# Altium footprint library TH Connectors.PcbLib: 140 footprints (part 9 of 9)
Each footprint in its own frame and in the unit in brackets; x right, y up, seen from the top. Pads: shape width x height; smd on the part's side, far side on the other; paste and mask are expansions set on the pad; w line width, h text height; cw(c..) or ccw(c..) is an arc to the next point about the centre after c.
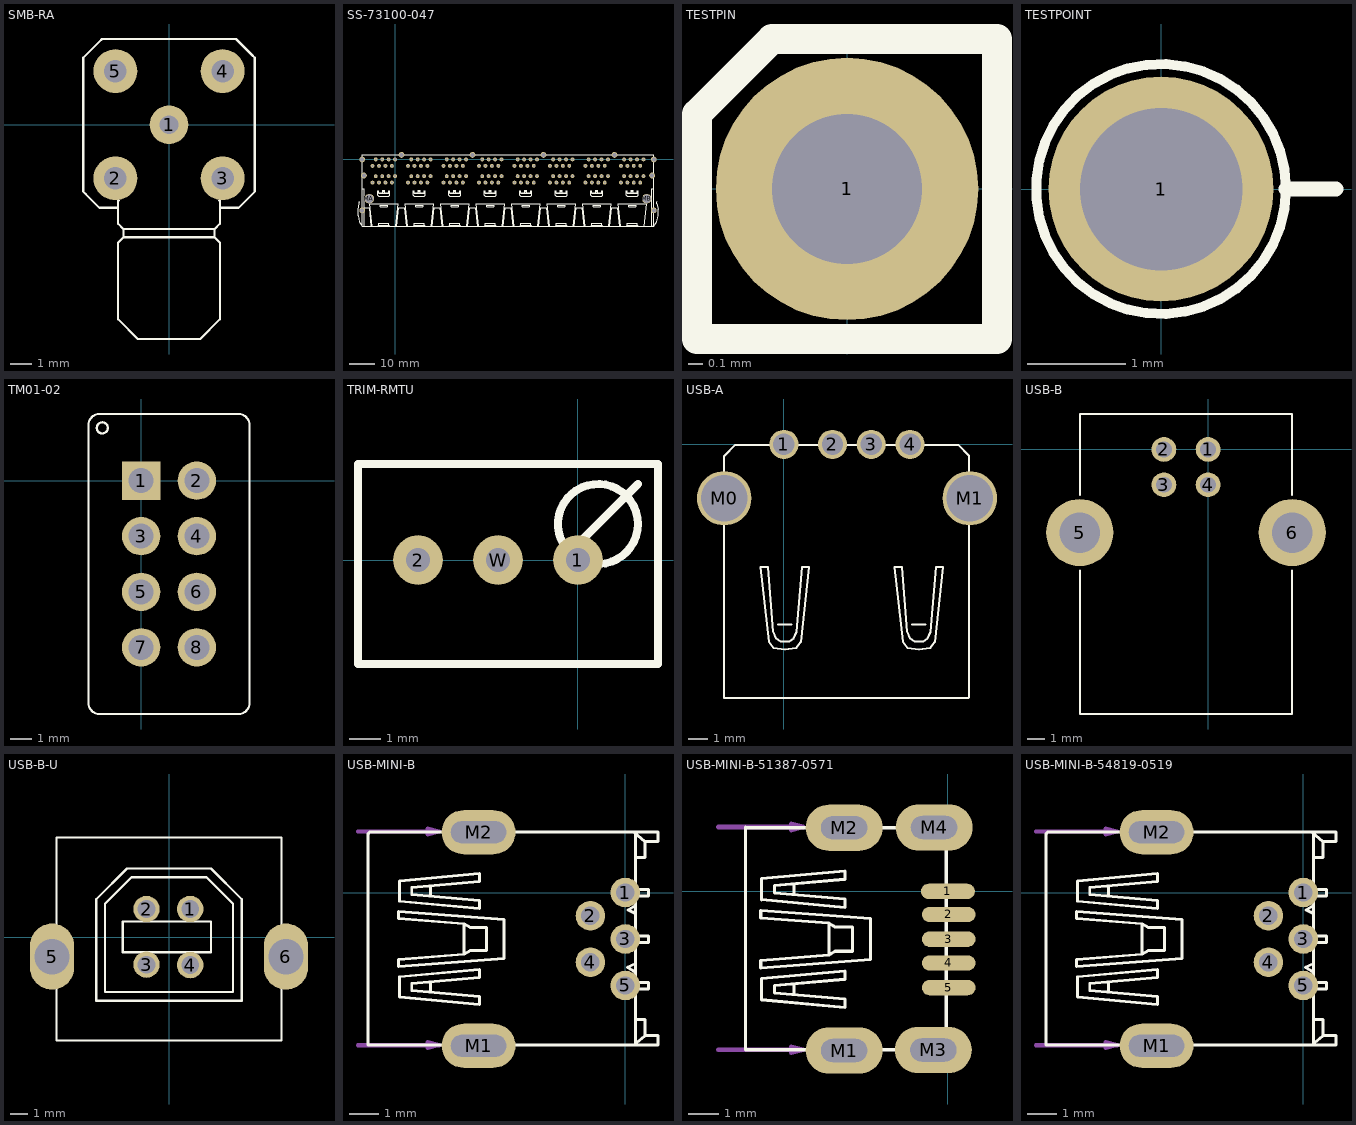
[diagram p8: the footprints below, top view; thin cyan lines are the x and y axes]

## SMB-RA [mil]
pads (5):
  round 72 hole 35: 1(0,0)
  round 82 hole 42: 2(-100,-100) 3(100,-100) 4(100,100) 5(-100,100)
Top Overlay:
  lines w4: -155,-130 -160,-125 ; -95,-155 -130,-155 -160,-125 ; -93.33,-141.67 -95,-140 -95,-185 -85,-195 ; 75,-383.33 58.33,-400 ; 93.33,-141.67 95,-140 95,-185 85,-195 ; 95,-155 130,-155 160,-125 160,80 ; 160,75 160,125 155,130 125,160 -125,160 -130,155 -160,125 -160,-125 ; -85,-210 -85,-200 -85,-195 ; -85,-210 -95,-220 -95,-363.33 -58.33,-400 ; -85,-210 85,-210 ; -85,-195 85,-195 ; -58.33,-400 -75,-383.33 -58.33,-400 ; -58.33,-400 58.33,-400 ; 58.33,-400 95,-363.33 95,-220 85,-210 ; 85,-210 85,-200 85,-195

## SS-73100-047 [mil]
pads (140):
  round 60 hole 40: A1(0,0)
  round 60 hole 30: A2(-50,-100) A3(-100,0) A4(-150,-100) A5(-200,0) A6(-250,-100) A7(-300,0) A8(-350,-100) B1(550,0) B2(500,-100) B3(450,0) B4(400,-100) B5(350,0) B6(300,-100) B7(250,0) B8(200,-100) C1(1100,0) C2(1050,-100) C3(1000,0) C4(950,-100) C5(900,0) C6(850,-100) C7(800,0) C8(750,-100) D1(1650,0) D2(1600,-100) D3(1550,0) D4(1500,-100) D5(1450,0) D6(1400,-100) D7(1350,0) D8(1300,-100) E1(2200,0) E2(2150,-100) E3(2100,0) E4(2050,-100) E5(2000,0) E6(1950,-100) E7(1900,0) E8(1850,-100) F1(2750,0) F2(2700,-100) F3(2650,0) F4(2600,-100) F5(2550,0) F6(2500,-100) F7(2450,0) F8(2400,-100) G1(3300,0) G2(3250,-100) G3(3200,0) G4(3150,-100) G5(3100,0) G6(3050,-100) G7(3000,0) G8(2950,-100) H1(3850,0) H2(3800,-100) H3(3750,0) H4(3700,-100) H5(3650,0) H6(3600,-100) H7(3550,0) H8(3500,-100) I1(-350,-360) I2(-300,-260) I3(-250,-360) I4(-200,-260) I5(-150,-360) I6(-100,-260) I7(-50,-360) I8(0,-260) J1(200,-360) J2(250,-260) J3(300,-360) J4(350,-260) J5(400,-360) J6(450,-260) J7(500,-360) J8(550,-260) K1(750,-360) K2(800,-260) K3(850,-360) K4(900,-260) K5(950,-360) K6(1000,-260) K7(1050,-360) K8(1100,-260) L1(1300,-360) L2(1350,-260) L3(1400,-360) L4(1450,-260) L5(1500,-360) L6(1550,-260) L7(1600,-360) L8(1650,-260) M1(1850,-360) M2(1900,-260) M3(1950,-360) M4(2000,-260) M5(2050,-360) M6(2100,-260) M7(2150,-360) M8(2200,-260) N1(2400,-360) N2(2450,-260) N3(2500,-360) N4(2550,-260) N5(2600,-360) N6(2650,-260) N7(2700,-360) N8(2750,-260) O1(2950,-360) O2(3000,-260) O3(3050,-360) O4(3100,-260) O5(3150,-360) O6(3200,-260) O7(3250,-360) O8(3300,-260) P1(3500,-360) P2(3550,-260) P3(3600,-360) P4(3650,-260) P5(3700,-360) P6(3750,-260) P7(3800,-360) P8(3850,-260)
  round 150 hole 131 unplated: MA(-400,-610) MB(3900,-610)
  round 90 hole 62: MC(-510,-790) MD(-484,-250) ME(-510,-1) MF(100,70) MG(1200,70) MH(2300,70) MI(3400,70) MJ(4010,-1) MK(3984,-250) ML(4010,-790)
Top Overlay:
  drawing of 374 lines, arcs and shapes, not listed

## TESTPIN [mil]
pads (1):
  round 70 hole 40: 1(0,0)
Top Overlay:
  lines w8: -40,-40 -40,20 -20,40 40,40 40,-40 -40,-40
3D body: height 40, standoff 0, extent -40,-40 40,40
3D body: height 470, standoff -120, extent -15,-15 15,15

## TESTPOINT [mil]
pads (1):
  round 90 hole 65: 1(0,0)
Top Overlay:
  circle w4: c0,0 r50
  lines w6: 50,0 70,0
3D body: height 253.89, standoff 146.11, extent -53.79,-23.5 53.79,21.5
3D body: height 150, standoff -100, extent -19.84,-20 20,19.92
3D body: height 125, standoff 5, extent -52,-51.79 51.59,52

## TM01-02 [mil]
pads (8):
  rect 69x69 hole 45: 1(0,0)
  round 69 hole 45: 2(100,0) 3(0,-100) 4(100,-100) 5(0,-200) 6(100,-200) 7(0,-300) 8(100,-300)
Top Overlay:
  circle w4: c-70,95 r10
  lines w4: -95,-400 ccw(c-75,-400) -75,-420 50,-420 175,-420 ccw(c175,-400) 195,-400 195,100 ccw(c175,100) 175,120 50,120 -75,120 ccw(c-75,100) -95,100 -95,-400

## TRIM-RMTU [mil]
pads (3):
  round 62 hole 30: 1(0,0) 2(-200,0) W(-100,0)
Top Overlay:
  circle w10: c25,45 r50
  lines w10: -25,-5 50,70 ; 25,45 75,95 ; -275,-130 100,-130 100,120 -275,120 -275,-130

## USB-A [mm]
pads (6):
  round 1.5 hole 1.1: 1(0,0) 2(2.5,0) 3(4.5,0) 4(6.5,0)
  round 2.8 hole 2.4: M0(-3.075,-2.775) M1(9.575,-2.775)
Top Overlay:
  lines w0.102: -0.3,-9.275 0.025,-9.275 ; 0.075,-9.275 0.4,-9.275 ; 6.6,-9.275 6.925,-9.275 ; 6.975,-9.275 7.3,-9.275 ; -3.075,-13.075 9.5,-13.075 9.525,-13.05 9.525,-0.575 8.975,-0.025 -2.5,-0.025 -3.075,-0.6 -3.075,-2.775 -3.075,-13.075 ; -1.2,-6.325 -0.775,-10.175 -0.525,-10.5 0.05,-10.575 0.625,-10.5 0.875,-10.175 1.3,-6.325 0.925,-6.325 0.65,-9.65 0.5,-10 0.275,-10.15 0.05,-10.15 -0.175,-10.15 -0.4,-10 -0.55,-9.65 -0.825,-6.325 -1.2,-6.325 ; 5.7,-6.325 6.125,-10.175 6.375,-10.5 6.95,-10.575 7.525,-10.5 7.775,-10.175 8.2,-6.325 7.825,-6.325 7.55,-9.65 7.4,-10 7.175,-10.15 6.95,-10.15 6.725,-10.15 6.5,-10 6.35,-9.65 6.075,-6.325 5.7,-6.325

## USB-B [mil]
pads (6):
  round 55 hole 35: 1(0,0) 2(-98.42,0) 3(-98.42,-78.74) 4(0,-78.74)
  round 150 hole 90.55: 5(-286.22,-185.43) 6(187.8,-185.43)
Top Overlay:
  lines w4: -285.43,-269.29 -285.43,-590.16 187.01,-590.16 187.01,-269.29 ; -285.43,-101.58 -285.43,79.13 187.01,79.13 187.01,-101.58
3D body: height 436.54, standoff -162.68, extent -342.51,-589.79 242.51,79.5

## USB-B-U [mil]
pads (6):
  round 60 hole 40 mask+2: 1(48,63.5) 2(-51,63.5) 3(-51,-62.5) 4(48,-63.5)
  oval 100x150 hole 80 mask+2: 5(-265,-44.5) 6(265,-44.5)
Top Overlay:
  lines w5: -185,225.5 195,225.5 ; -165,-234.5 125,-234.5 ; 255,-134.5 255,175.5 ; -255,-234.5 -255,-144.5 -255,185.5 -255,225.5 255,225.5 255,-234.5 -255,-234.5 ; -165,-144.5 -165,85.5 -95,155.5 65,155.5 95,155.5 165,85.5 165,-144.5 -165,-144.5 ; -145,-124.5 145,-124.5 145,75.5 85,135.5 -85,135.5 -145,75.5 -145,-124.5 ; -105,-34.5 -105,35.5 95,35.5 95,-34.5 -105,-34.5
3D body: height 640, standoff -149.21, extent -290.12,-235.13 288.62,209.75

## USB-MINI-B [mil]
pads (7):
  round 40 hole 25: 1(0,0) 2(-47.24,-31.5) 3(0,-62.99) 4(-47.24,-94.49) 5(0,-125.98)
  oval 100x60 hole 30 slot 75 at 0 deg: M1(-198.82,-207.68) M2(-198.82,81.69)
Top Overlay:
  lines w4: -348.43,-206.69 44.29,-206.69 44.29,-193.9 26.57,-193.9 ; -348.43,79.72 -346.46,81.69 44.29,81.69 44.29,68.9 26.57,68.9 ; -348.43,-206.69 -348.43,79.72 ; -289.37,-124.02 -289.37,-132.87 -197.83,-140.75 -197.83,-151.57 -306.1,-141.73 -306.1,-114.17 -197.83,-104.33 -197.83,-115.16 -289.37,-123.03 ; -289.37,-2.95 -197.83,-10.83 -197.83,-21.65 -306.1,-11.81 -306.1,15.75 -197.83,25.59 -197.83,14.76 -289.37,6.89 -289.37,-1.97 ; -263.78,-133.86 -263.78,-123.03 ; -263.78,-2.95 -263.78,7.87 ; 11.81,-206.69 26.57,-193.9 ; 11.81,81.69 26.57,68.9 ; 13.78,-130.91 31.5,-130.91 31.5,-122.05 13.78,-122.05 ; 13.78,-108.27 2.95,-101.38 13.78,-96.46 ; 13.78,-67.91 31.5,-67.91 31.5,-59.05 13.78,-59.05 ; 13.78,-28.54 3.94,-23.62 13.78,-17.72 ; 13.78,-4.92 31.5,-4.92 31.5,3.94 13.78,3.94 ; -218.5,-83.66 -307.09,-90.55 -307.09,-100.39 -164.37,-89.57 -164.37,-62.99 -164.37,-36.42 -307.09,-25.59 -307.09,-35.43 -218.5,-42.32 ; -218.5,-83.66 -210.63,-78.74 -187.99,-78.74 -187.99,-62.99 -187.99,-47.24 -210.63,-47.24 -218.5,-42.32 ; -218.5,-83.66 -218.5,-62.99 -218.5,-42.32 ; 26.57,-193.9 26.57,-172.24 13.78,-172.24 13.78,-206.69 13.78,81.69 13.78,47.24 26.57,47.24 26.57,68.9
Mechanical 1:
  lines w6: -362.2,-206.69 -251.97,-206.69 ; -362.2,82.68 -251.97,82.68 ; -196.85,-194.88 -175.2,-194.88 cw(c-175.2,-208.66) -161.42,-208.66 cw(c-175.2,-208.66) -175.2,-222.44 -224.41,-222.44 cw(c-224.41,-210.63) -236.22,-210.63 -236.22,-206.69 cw(c-224.41,-206.69) -224.41,-194.88 -177.17,-194.88 ; -196.85,94.49 -175.2,94.49 cw(c-175.2,80.71) -161.42,80.71 cw(c-175.2,80.71) -175.2,66.93 -224.41,66.93 cw(c-224.41,78.74) -236.22,78.74 -236.22,82.68 cw(c-224.41,82.68) -224.41,94.49 -177.17,94.49 ; -251.97,-206.69 -267.72,-202.76 -267.72,-210.63 -251.97,-206.69 ; -251.97,82.68 -267.72,78.74 -267.72,86.61 -251.97,82.68
  text "1.9 mm X 0.7 mm slot" at -944.88,70.87 h30
  text "1.9 mm X 0.7 mm slot" at -937.01,-216.54 h30
3D body: height 161.77, standoff -64.61, extent -345.33,-214.07 9,89.07

## USB-MINI-B-51387-0571 [mil] "MOLEX 51387-0571"
pads (9):
  oval 70x20 smd: 1(0,0) 2(1,-30) 3(1,-61.99) 4(1,-93) 5(1,-124.98)
  oval 100x60 hole 30 slot 60 at 0 deg: M1(-134.82,-206.68) M2(-134.82,82.69) M3(-19,-206) M4(-18,83)
Top Overlay:
  lines w4: -225.37,-123.02 -225.37,-131.87 -133.83,-139.75 -133.83,-150.57 -242.1,-140.73 -242.1,-113.17 -133.83,-103.33 -133.83,-114.16 -225.37,-122.03 ; -225.37,-1.95 -133.83,-9.83 -133.83,-20.65 -242.1,-10.81 -242.1,16.75 -133.83,26.59 -133.83,15.76 -225.37,7.89 -225.37,-0.97 ; -199.78,-132.86 -199.78,-122.03 ; -199.78,-1.95 -199.78,8.87 ; -154.5,-82.66 -243.09,-89.55 -243.09,-99.39 -100.37,-88.57 -100.37,-61.99 -100.37,-35.42 -243.09,-24.59 -243.09,-34.43 -154.5,-41.32 ; -154.5,-82.66 -146.63,-77.74 -123.99,-77.74 -123.99,-61.99 -123.99,-46.24 -146.63,-46.24 -154.5,-41.32 ; -154.5,-82.66 -154.5,-61.99 -154.5,-41.32 ; -263,-205.69 -2.22,-205.69 -2.22,82.69 -262.02,82.69 -263,83.68 -263,-205.69
Mechanical 1:
  lines w6: -298.2,-205.69 -187.97,-205.69 ; -298.2,83.68 -187.97,83.68 ; -132.85,-193.88 -111.2,-193.88 cw(c-111.2,-207.66) -97.42,-207.66 cw(c-111.2,-207.66) -111.2,-221.44 -160.41,-221.44 cw(c-160.41,-209.63) -172.22,-209.63 -172.22,-205.69 cw(c-160.41,-205.69) -160.41,-193.88 -113.17,-193.88 ; -132.85,95.49 -111.2,95.49 cw(c-111.2,81.71) -97.42,81.71 cw(c-111.2,81.71) -111.2,67.93 -160.41,67.93 cw(c-160.41,79.74) -172.22,79.74 -172.22,83.68 cw(c-160.41,83.68) -160.41,95.49 -113.17,95.49 ; -17.03,-193.2 4.62,-193.2 cw(c4.62,-206.98) 18.4,-206.98 cw(c4.62,-206.98) 4.62,-220.76 -44.59,-220.76 cw(c-44.59,-208.95) -56.4,-208.95 -56.4,-205.02 cw(c-44.59,-205.02) -44.59,-193.2 2.65,-193.2 ; -17.03,96.17 4.62,96.17 cw(c4.62,82.39) 18.4,82.39 cw(c4.62,82.39) 4.62,68.61 -44.59,68.61 cw(c-44.59,80.42) -56.4,80.42 -56.4,84.35 cw(c-44.59,84.35) -44.59,96.17 2.65,96.17 ; -187.97,-205.69 -203.72,-201.76 -203.72,-209.63 -187.97,-205.69 ; -187.97,83.68 -203.72,79.74 -203.72,87.61 -187.97,83.68
  text "1.4 mm X 0.7 mm slot" at -880.88,71.87 h30
  text "1.4 mm X 0.7 mm slot" at -873.01,-215.54 h30
3D body: height 165.71, standoff -64.61, extent -262.76,-213.57 1.01,89.58

## USB-MINI-B-54819-0519 [mil] "MOLEX 54819-0519"
pads (7):
  round 40 hole 25: 1(0,0) 2(-47.24,-31.5) 3(0,-62.99) 4(-47.24,-94.49) 5(0,-125.98)
  oval 100x60 hole 30 slot 75 at 0 deg: M1(-198.82,-207.68) M2(-198.82,81.69)
Top Overlay:
  lines w4: -348.43,-206.69 44.29,-206.69 44.29,-193.9 26.57,-193.9 ; -348.43,79.72 -346.46,81.69 44.29,81.69 44.29,68.9 26.57,68.9 ; -348.43,-206.69 -348.43,79.72 ; -289.37,-124.02 -289.37,-132.87 -197.83,-140.75 -197.83,-151.57 -306.1,-141.73 -306.1,-114.17 -197.83,-104.33 -197.83,-115.16 -289.37,-123.03 ; -289.37,-2.95 -197.83,-10.83 -197.83,-21.65 -306.1,-11.81 -306.1,15.75 -197.83,25.59 -197.83,14.76 -289.37,6.89 -289.37,-1.97 ; -263.78,-133.86 -263.78,-123.03 ; -263.78,-2.95 -263.78,7.87 ; 11.81,-206.69 26.57,-193.9 ; 11.81,81.69 26.57,68.9 ; 13.78,-130.91 31.5,-130.91 31.5,-122.05 13.78,-122.05 ; 13.78,-108.27 2.95,-101.38 13.78,-96.46 ; 13.78,-67.91 31.5,-67.91 31.5,-59.05 13.78,-59.05 ; 13.78,-28.54 3.94,-23.62 13.78,-17.72 ; 13.78,-4.92 31.5,-4.92 31.5,3.94 13.78,3.94 ; -218.5,-83.66 -218.5,-62.99 -218.5,-42.32 ; -218.5,-83.66 -210.63,-78.74 -187.99,-78.74 -187.99,-62.99 -187.99,-47.24 -210.63,-47.24 -218.5,-42.32 ; -218.5,-83.66 -307.09,-90.55 -307.09,-100.39 -164.37,-89.57 -164.37,-62.99 -164.37,-36.42 -307.09,-25.59 -307.09,-35.43 -218.5,-42.32 ; 26.57,-193.9 26.57,-172.24 13.78,-172.24 13.78,-206.69 13.78,81.69 13.78,47.24 26.57,47.24 26.57,68.9
Mechanical 1:
  lines w6: -362.2,-206.69 -251.97,-206.69 ; -362.2,82.68 -251.97,82.68 ; -196.85,-194.88 -175.2,-194.88 cw(c-175.2,-208.66) -161.42,-208.66 cw(c-175.2,-208.66) -175.2,-222.44 -224.41,-222.44 cw(c-224.41,-210.63) -236.22,-210.63 -236.22,-206.69 cw(c-224.41,-206.69) -224.41,-194.88 -177.17,-194.88 ; -196.85,94.49 -175.2,94.49 cw(c-175.2,80.71) -161.42,80.71 cw(c-175.2,80.71) -175.2,66.93 -224.41,66.93 cw(c-224.41,78.74) -236.22,78.74 -236.22,82.68 cw(c-224.41,82.68) -224.41,94.49 -177.17,94.49 ; -251.97,-206.69 -267.72,-210.63 -267.72,-202.76 -251.97,-206.69 ; -251.97,82.68 -267.72,86.61 -267.72,78.74 -251.97,82.68
  text "1.9 mm X 0.7 mm slot" at -937.01,-216.54 h30
  text "1.9 mm X 0.7 mm slot" at -944.88,70.87 h30
3D body: height 161.77, standoff -64.61, extent -345.33,-214.07 9,89.07